# Altium footprint library 7-Connectors-10.PcbLib: 25 footprints (part 1 of 2)
Each footprint in its own frame and in the unit in brackets; x right, y up, seen from the top. Pads: shape width x height; smd on the part's side, far side on the other; paste and mask are expansions set on the pad; w line width, h text height; cw(c..) or ccw(c..) is an arc to the next point about the centre after c.
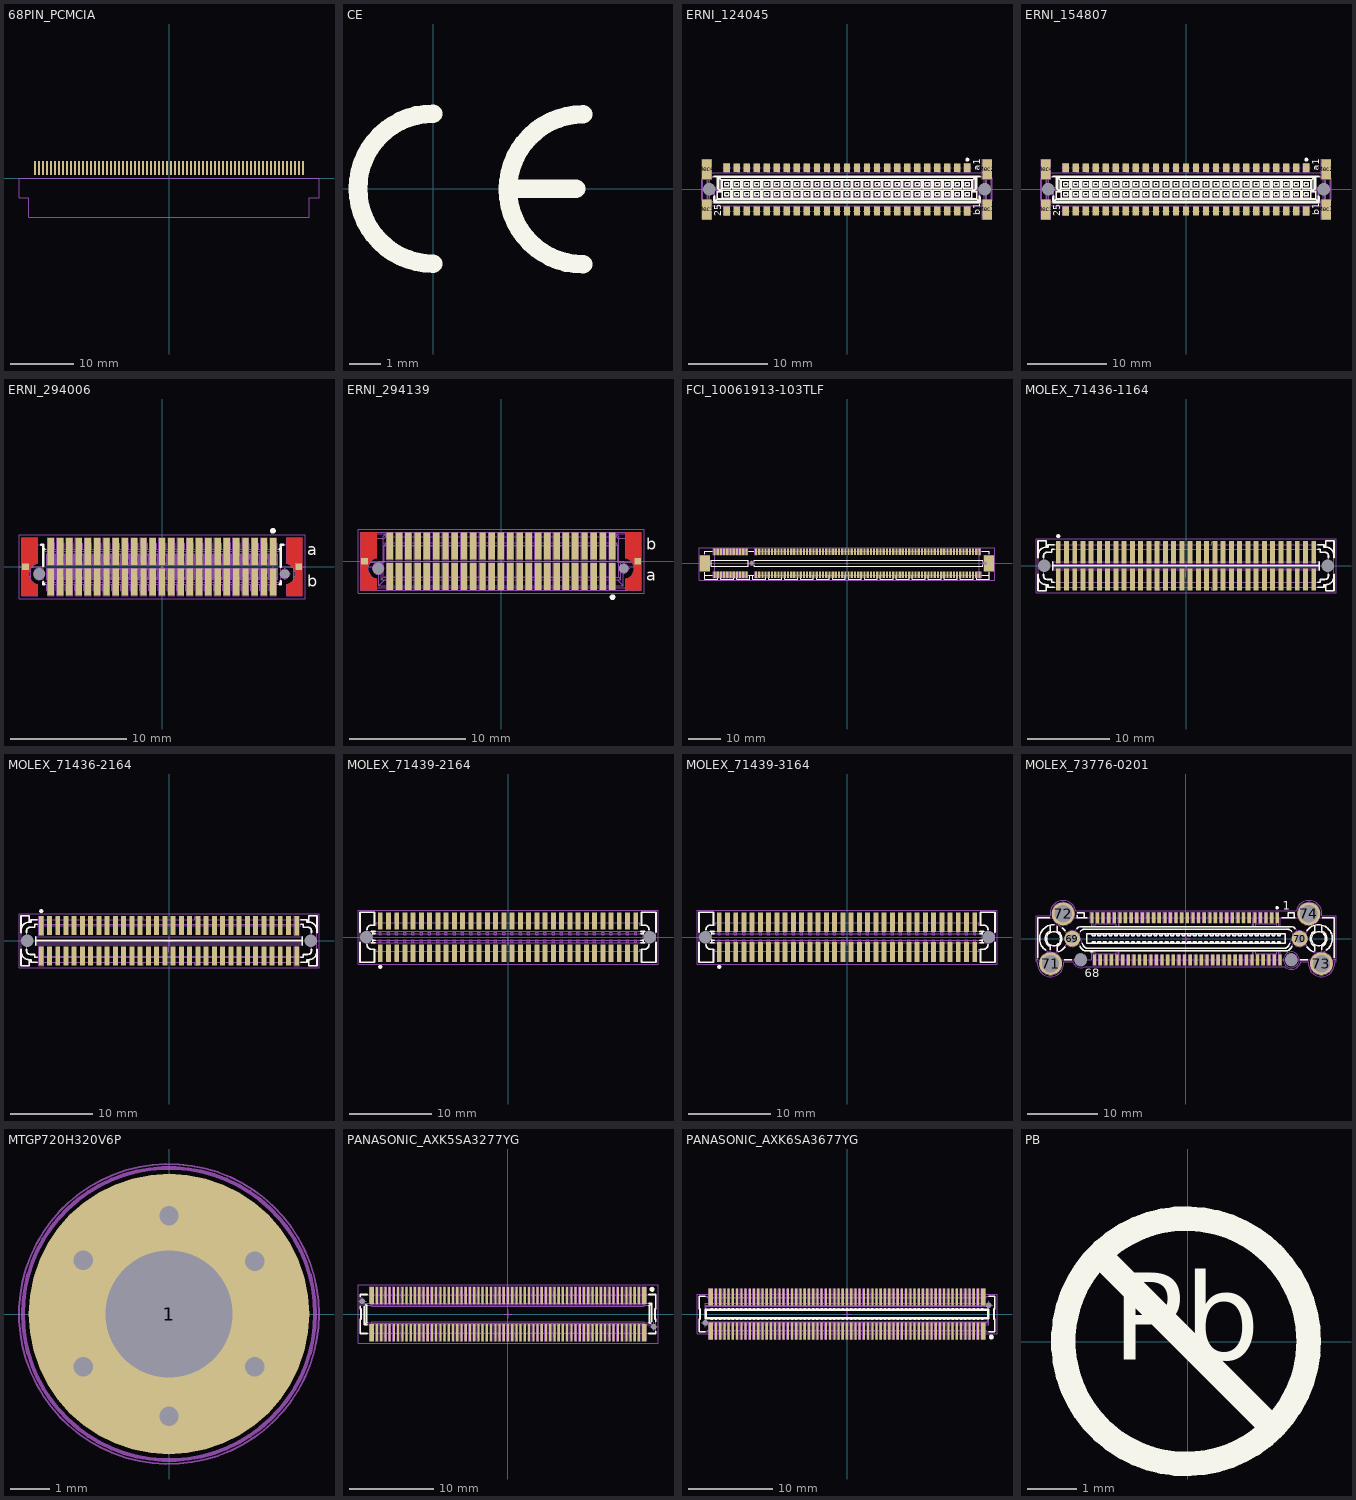
[diagram p0: the footprints below, top view; thin cyan lines are the x and y axes]

## 68PIN_PCMCIA [mil]
height 264.57
pads (68):
  oval 12x90 smd mask+2: 1_68(-837.5,64.81) 2_34(-812.5,64.81) 3_67(-787.5,64.81) 4_33(-762.5,64.81) 5_66(-737.5,64.81) 6_32(-712.5,64.81) 7_65(-687.5,64.81) 8_31(-662.5,64.81) 9_64(-637.5,64.81) 10_3(-612.5,64.81) 11_6(-587.5,64.81) 12_2(-562.5,64.81) 13_6(-537.5,64.81) 14_2(-512.5,64.81) 15_6(-487.5,64.81) 16_2(-462.5,64.81) 17_6(-437.5,64.81) 18_2(-412.5,64.81) 19_5(-387.5,64.81) 20_2(-362.5,64.81) 21_5(-337.5,64.81) 22_2(-312.5,64.81) 23-N(-287.5,64.81) 24_2(-262.5,64.81) 25-N(-237.5,64.81) 26_2(-212.5,64.81) 27-N(-187.5,64.81) 28-N(-162.5,64.81) 29-N(-137.5,64.81) 30-N(-112.5,64.81) 31-N(-87.5,64.81) 32-N(-62.5,64.81) 33-N(-37.5,64.81) 34-N(-12.5,64.81) 35_5(12.5,64.81) 36_1(37.5,64.81) 37-N(62.5,64.81) 38_1(87.5,64.81) 39_4(112.5,64.81) 40_1(137.5,64.81) 41-N(162.5,64.81) 42-N(187.5,64.81) 43-N(212.5,64.81) 44-N(237.5,64.81) 45-N(262.5,64.81) 46_1(287.5,64.81) 47_4(312.5,64.81) 48_1(337.5,64.81) 49_4(362.5,64.81) 50-N(387.5,64.81) 51-N(412.5,64.81) 52_9(437.5,64.81) 53_4(462.5,64.81) 54_8(487.5,64.81) 55_4(512.63,64.81) 56_7(537.5,64.81) 57_4(562.63,64.81) 58_6(587.5,64.81) 59_3(612.5,64.81) 60_5(637.5,64.81) 61_3(662.5,64.81) 62_4(687.5,64.81) 63_3(712.5,64.81) 64_3(737.5,64.81) 65_3(762.5,64.81) 66_2(787.5,64.81) 67_3(812.5,64.81) 68_1(837.5,64.81)
Mechanical 1:
  lines w4: -937,-122 -876,-122 -876,-242 876,-242 876,-122 937,-122 937,0 -937,0 -937,-122

## CE [mm]
Top Overlay:
  lines w0.6: 0,-2.413 cw(c0,0) 0,2.413 ; 2.53,0 4.6,0 ; 4.826,-2.438 cw(c4.826,-0.025) 4.826,2.388
3D body "ce.stp": height 0.02, standoff 0, extent -2.725,-2.725 4.82,2.725

## ERNI_124045 [mm] "50 Contacts Pitch 1.27  SMC Straight Female Connector Type B"
height 9.05
pads (56):
  rect 0.8x1.1 smd: A1(15.24,2.75) A2(13.97,2.75) A3(12.7,2.75) A4(11.43,2.75) A5(10.16,2.75) A6(8.89,2.75) A7(7.62,2.75) A8(6.35,2.75) A9(5.08,2.75) A10(3.81,2.75) A11(2.54,2.75) A12(1.27,2.75) A13(0,2.75) A14(-1.27,2.75) A15(-2.54,2.75) A16(-3.81,2.75) A17(-5.08,2.75) A18(-6.35,2.75) A19(-7.62,2.75) A20(-8.89,2.75) A21(-10.16,2.75) A22(-11.43,2.75) A23(-12.7,2.75) A24(-13.97,2.75) A25(-15.24,2.75) B1(15.24,-2.75) B2(13.97,-2.75) B3(12.7,-2.75) B4(11.43,-2.75) B5(10.16,-2.75) B6(8.89,-2.75) B7(7.62,-2.75) B8(6.35,-2.75) B9(5.08,-2.75) B10(3.81,-2.75) B11(2.54,-2.75) B12(1.27,-2.75) B13(0,-2.75) B14(-1.27,-2.75) B15(-2.54,-2.75) B16(-3.81,-2.75) B17(-5.08,-2.75) B18(-6.35,-2.75) B19(-7.62,-2.75) B20(-8.89,-2.75) B21(-10.16,-2.75) B22(-11.43,-2.75) B23(-12.7,-2.75) B24(-13.97,-2.75) B25(-15.24,-2.75)
  rect 1.2x2.5 smd: Mec1(17.75,-2.55) Mec2(17.75,2.55) Mec3(-17.75,-2.55) Mec4(-17.75,2.55)
  round 1 hole 1.6 unplated mask+0.3: Mec5(17.45,0) Mec6(-17.45,0)
Top Overlay:
  drawing of 448 lines, arcs and shapes, not listed
  text "25" at -15.9,-3.4 h0.9
  text "a1" at 16.865,2.375 h0.9
  text "b1" at 16.865,-3.275 h0.9
Mechanical 8:
  drawing of 260 lines, arcs and shapes, not listed
Mechanical 14:
  drawing of 1664 lines, arcs and shapes, not listed
  text "a1" at 16.865,2.375 h0.9
  text "b1" at 16.865,-3.275 h0.9
3D body "ERNI_124045.stp": height 9.05, standoff -0.75, extent -18.415,-3.5 18.415,3.5

## ERNI_154807 [mm] "50 Contacts Pitch 1.27  SMC Straight Female Connector Type B"
height 6.25
pads (56):
  rect 0.8x1.1 smd: A1(15.24,2.75) A2(13.97,2.75) A3(12.7,2.75) A4(11.43,2.75) A5(10.16,2.75) A6(8.89,2.75) A7(7.62,2.75) A8(6.35,2.75) A9(5.08,2.75) A10(3.81,2.75) A11(2.54,2.75) A12(1.27,2.75) A13(0,2.75) A14(-1.27,2.75) A15(-2.54,2.75) A16(-3.81,2.75) A17(-5.08,2.75) A18(-6.35,2.75) A19(-7.62,2.75) A20(-8.89,2.75) A21(-10.16,2.75) A22(-11.43,2.75) A23(-12.7,2.75) A24(-13.97,2.75) A25(-15.24,2.75) B1(15.24,-2.75) B2(13.97,-2.75) B3(12.7,-2.75) B4(11.43,-2.75) B5(10.16,-2.75) B6(8.89,-2.75) B7(7.62,-2.75) B8(6.35,-2.75) B9(5.08,-2.75) B10(3.81,-2.75) B11(2.54,-2.75) B12(1.27,-2.75) B13(0,-2.75) B14(-1.27,-2.75) B15(-2.54,-2.75) B16(-3.81,-2.75) B17(-5.08,-2.75) B18(-6.35,-2.75) B19(-7.62,-2.75) B20(-8.89,-2.75) B21(-10.16,-2.75) B22(-11.43,-2.75) B23(-12.7,-2.75) B24(-13.97,-2.75) B25(-15.24,-2.75)
  rect 1.2x2.5 smd: Mec1(17.75,-2.55) Mec2(17.75,2.55) Mec3(-17.75,-2.55) Mec4(-17.75,2.55)
  round 1 hole 1.6 unplated mask+0.3: Mec5(17.45,0) Mec6(-17.45,0)
Top Overlay:
  drawing of 448 lines, arcs and shapes, not listed
  text "25" at -15.9,-3.4 h0.9
  text "a1" at 16.865,2.375 h0.9
  text "b1" at 16.865,-3.275 h0.9
Mechanical 8:
  drawing of 260 lines, arcs and shapes, not listed
Mechanical 14:
  drawing of 1664 lines, arcs and shapes, not listed
  text "a1" at 16.865,2.375 h0.9
  text "b1" at 16.865,-3.275 h0.9
3D body "ERNI_154807.stp": height 6.25, standoff -0.75, extent -18.415,-3.5 18.415,3.5

## ERNI_294006 [mm] "50 Contacts Pitch 0.8  SMT Vertical Female Connector Type MicroCon"
height 4
pads (54):
  rect 0.55x2.35 smd: A1(9.6,1.325) A2(8.8,1.325) A3(8,1.325) A4(7.2,1.325) A5(6.4,1.325) A6(5.6,1.325) A7(4.8,1.325) A8(4,1.325) A9(3.2,1.325) A10(2.4,1.325) A11(1.6,1.325) A12(0.8,1.325) A13(0,1.325) A14(-0.8,1.325) A15(-1.6,1.325) A16(-2.4,1.325) A17(-3.2,1.325) A18(-4,1.325) A19(-4.8,1.325) A20(-5.6,1.325) A21(-6.4,1.325) A22(-7.2,1.325) A23(-8,1.325) A24(-8.8,1.325) A25(-9.6,1.325) B1(9.6,-1.325) B2(8.8,-1.325) B3(8,-1.325) B4(7.2,-1.325) B5(6.4,-1.325) B6(5.6,-1.325) B7(4.8,-1.325) B8(4,-1.325) B9(3.2,-1.325) B10(2.4,-1.325) B11(1.6,-1.325) B12(0.8,-1.325) B13(0,-1.325) B14(-0.8,-1.325) B15(-1.6,-1.325) B16(-2.4,-1.325) B17(-3.2,-1.325) B18(-4,-1.325) B19(-4.8,-1.325) B20(-5.6,-1.325) B21(-6.4,-1.325) B22(-7.2,-1.325) B23(-8,-1.325) B24(-8.8,-1.325) B25(-9.6,-1.325)
  rect 0.6x0.6 smd: MEC1(-11.8,0) MEC2(11.8,0)
  round 0.5 hole 0.8 unplated mask+0.15: Mec5(10.6,-0.625)
  round 0.5 hole 1 unplated mask+0.25: Mec6(-10.6,-0.625)
Top Layer:
  region: -12.1,-2.5 -10.75,-2.5 -10.75,-1.512 -10.852,-1.489 -11.046,-1.407 -11.215,-1.282 -11.35,-1.122 -11.445,-0.934 -11.494,-0.73 -11.494,-0.52 -11.445,-0.316 -11.35,-0.128 -11.215,0.032 -11.046,0.157 -10.852,0.239 -10.75,0.262 -10.75,2.5 -12.1,2.5
  region: 10.75,-2.5 12.1,-2.5 12.1,2.5 10.75,2.5 10.75,0.262 10.853,0.239 11.046,0.157 11.215,0.032 11.351,-0.128 11.445,-0.316 11.494,-0.52 11.494,-0.73 11.445,-0.934 11.351,-1.122 11.215,-1.282 11.046,-1.407 10.853,-1.489 10.75,-1.512
Top Overlay:
  circle w0.25: c9.575,3.101 r0.125
  lines w0.2: -10.45,1.9 -10.25,1.9 -10.25,0.094 ; -10.25,-1.344 -10.25,-1.5 -10.175,-1.5 ; -10.25,1.5 -10.175,1.5 ; 10.175,-1.5 10.25,-1.5 10.25,-1.231 ; 10.175,1.5 10.25,1.5 ; 10.25,0 10.25,1.9 10.45,1.9
  text "a" at 12.55,1 h1
  text "b" at 12.525,-1.705 h1
Mechanical 8:
  drawing of 338 lines, arcs and shapes, not listed
Mechanical 14:
  drawing of 978 lines, arcs and shapes, not listed
  text "a" at 12.55,1 h1
  text "b" at 12.525,-1.705 h1
Mechanical 15:
  lines w0.05: -12.35,-2.75 12.35,-2.75 12.35,2.75 -12.35,2.75 -12.35,-2.75
3D body "ERNI_294006.stp": height 4.6, standoff -0.7, extent -11.95,-2.35 11.95,2.35

## ERNI_294139 [mm] "50 Contacts Pitch 0.8  SMT Vertical Male Connector Type MicroCon"
height 4.8
pads (54):
  rect 0.55x2.35 smd: A1(9.6,-1.325) A2(8.8,-1.325) A3(8,-1.325) A4(7.2,-1.325) A5(6.4,-1.325) A6(5.6,-1.325) A7(4.8,-1.325) A8(4,-1.325) A9(3.2,-1.325) A10(2.4,-1.325) A11(1.6,-1.325) A12(0.8,-1.325) A13(0,-1.325) A14(-0.8,-1.325) A15(-1.6,-1.325) A16(-2.4,-1.325) A17(-3.2,-1.325) A18(-4,-1.325) A19(-4.8,-1.325) A20(-5.6,-1.325) A21(-6.4,-1.325) A22(-7.2,-1.325) A23(-8,-1.325) A24(-8.8,-1.325) A25(-9.6,-1.325) B1(9.6,1.325) B2(8.8,1.325) B3(8,1.325) B4(7.2,1.325) B5(6.4,1.325) B6(5.6,1.325) B7(4.8,1.325) B8(4,1.325) B9(3.2,1.325) B10(2.4,1.325) B11(1.6,1.325) B12(0.8,1.325) B13(0,1.325) B14(-0.8,1.325) B15(-1.6,1.325) B16(-2.4,1.325) B17(-3.2,1.325) B18(-4,1.325) B19(-4.8,1.325) B20(-5.6,1.325) B21(-6.4,1.325) B22(-7.2,1.325) B23(-8,1.325) B24(-8.8,1.325) B25(-9.6,1.325)
  rect 0.6x0.6 smd: MEC1(-11.8,0) MEC2(11.8,0)
  round 0.5 hole 0.8 unplated mask+0.15: Mec5(10.6,-0.625)
  round 0.5 hole 1 unplated mask+0.25: Mec6(-10.6,-0.625)
Top Layer:
  region: -12.1,-2.5 -10.75,-2.5 -10.75,-1.512 -10.852,-1.489 -11.046,-1.407 -11.215,-1.282 -11.35,-1.122 -11.445,-0.934 -11.494,-0.73 -11.494,-0.52 -11.445,-0.316 -11.35,-0.128 -11.215,0.032 -11.046,0.157 -10.852,0.239 -10.75,0.262 -10.75,2.5 -12.1,2.5
  region: 10.75,-2.5 12.1,-2.5 12.1,2.5 10.75,2.5 10.75,0.262 10.853,0.239 11.046,0.157 11.215,0.032 11.351,-0.128 11.445,-0.316 11.494,-0.52 11.494,-0.73 11.445,-0.934 11.351,-1.122 11.215,-1.282 11.046,-1.407 10.853,-1.489 10.75,-1.512
Top Overlay:
  circle w0.25: c9.625,-3.101 r0.125
  text "b" at 12.55,1 h1
  text "a" at 12.525,-1.705 h1
Mechanical 8:
  drawing of 377 lines, arcs and shapes, not listed
Mechanical 14:
  drawing of 256 lines, arcs and shapes, not listed
  text "b" at 12.55,1 h1
  text "a" at 12.525,-1.705 h1
Mechanical 15:
  lines w0.05: -12.35,-2.75 -12.35,2.75 12.35,2.75 12.35,-2.75 -12.35,-2.75
3D body "ERNI_294139.stp": height 4.8, standoff -0.7, extent -12.1,-2.5 12.1,2.5

## FCI_10061913-103TLF [mm] "164 Positions PCI Express Surface Mount Card Edge Connector"
height 11.1
pads (168):
  rect 0.7x2 smd: A1(-41.5,3.6) A2(-40.5,3.6) A3(-39.5,3.6) A4(-38.5,3.6) A5(-37.5,3.6) A6(-36.5,3.6) A7(-35.5,3.6) A8(-34.5,3.6) A9(-33.5,3.6) A10(-32.5,3.6) A11(-31.5,3.6) A12(-28.5,3.6) A13(-27.5,3.6) A14(-26.5,3.6) A15(-25.5,3.6) A16(-24.5,3.6) A17(-23.5,3.6) A18(-22.5,3.6) A19(-21.5,3.6) A20(-20.5,3.6) A21(-19.5,3.6) A22(-18.5,3.6) A23(-17.5,3.6) A24(-16.5,3.6) A25(-15.5,3.6) A26(-14.5,3.6) A27(-13.5,3.6) A28(-12.5,3.6) A29(-11.5,3.6) A30(-10.5,3.6) A31(-9.5,3.6) A32(-8.5,3.6) A33(-7.5,3.6) A34(-6.5,3.6) A35(-5.5,3.6) A36(-4.5,3.6) A37(-3.5,3.6) A38(-2.5,3.6) A39(-1.5,3.6) A40(-0.5,3.6) A41(0.5,3.6) A42(1.5,3.6) A43(2.5,3.6) A44(3.5,3.6) A45(4.5,3.6) A46(5.5,3.6) A47(6.5,3.6) A48(7.5,3.6) A49(8.5,3.6) A50(9.5,3.6) A51(10.5,3.6) A52(11.5,3.6) A53(12.5,3.6) A54(13.5,3.6) A55(14.5,3.6) A56(15.5,3.6) A57(16.5,3.6) A58(17.5,3.6) A59(18.5,3.6) A60(19.5,3.6) A61(20.5,3.6) A62(21.5,3.6) A63(22.5,3.6) A64(23.5,3.6) A65(24.5,3.6) A66(25.5,3.6) A67(26.5,3.6) A68(27.5,3.6) A69(28.5,3.6) A70(29.5,3.6) A71(30.5,3.6) A72(31.5,3.6) A73(32.5,3.6) A74(33.5,3.6) A75(34.5,3.6) A76(35.5,3.6) A77(36.5,3.6) A78(37.5,3.6) A79(38.5,3.6) A80(39.5,3.6) A81(40.5,3.6) A82(41.5,3.6) B1(-41.5,-3.6) B2(-40.5,-3.6) B3(-39.5,-3.6) B4(-38.5,-3.6) B5(-37.5,-3.6) B6(-36.5,-3.6) B7(-35.5,-3.6) B8(-34.5,-3.6) B9(-33.5,-3.6) B10(-32.5,-3.6) B11(-31.5,-3.6) B12(-28.5,-3.6) B13(-27.5,-3.6) B14(-26.5,-3.6) B15(-25.5,-3.6) B16(-24.5,-3.6) B17(-23.5,-3.6) B18(-22.5,-3.6) B19(-21.5,-3.6) B20(-20.5,-3.6) B21(-19.5,-3.6) B22(-18.5,-3.6) B23(-17.5,-3.6) B24(-16.5,-3.6) B25(-15.5,-3.6) B26(-14.5,-3.6) B27(-13.5,-3.6) B28(-12.5,-3.6) B29(-11.5,-3.6) B30(-10.5,-3.6) B31(-9.5,-3.6) B32(-8.5,-3.6) B33(-7.5,-3.6) B34(-6.5,-3.6) B35(-5.5,-3.6) B36(-4.5,-3.6) B37(-3.5,-3.6) B38(-2.5,-3.6) B39(-1.5,-3.6) B40(-0.5,-3.6) B41(0.5,-3.6) B42(1.5,-3.6) B43(2.5,-3.6) B44(3.5,-3.6) B45(4.5,-3.6) B46(5.5,-3.6) B47(6.5,-3.6) B48(7.5,-3.6) B49(8.5,-3.6) B50(9.5,-3.6) B51(10.5,-3.6) B52(11.5,-3.6) B53(12.5,-3.6) B54(13.5,-3.6) B55(14.5,-3.6) B56(15.5,-3.6) B57(16.5,-3.6) B58(17.5,-3.6) B59(18.5,-3.6) B60(19.5,-3.6) B61(20.5,-3.6) B62(21.5,-3.6) B63(22.5,-3.6) B64(23.5,-3.6) B65(24.5,-3.6) B66(25.5,-3.6) B67(26.5,-3.6) B68(27.5,-3.6) B69(28.5,-3.6) B70(29.5,-3.6) B71(30.5,-3.6) B72(31.5,-3.6) B73(32.5,-3.6) B74(33.5,-3.6) B75(34.5,-3.6) B76(35.5,-3.6) B77(36.5,-3.6) B78(37.5,-3.6) B79(38.5,-3.6) B80(39.5,-3.6) B81(40.5,-3.6) B82(41.5,-3.6)
  rect 3x5 smd: MECH1(-44.5,0) MECH2(44.5,0)
  round 1 hole 1.2 unplated mask+0.1: POS1(-29.85,0) POS2(43.3,0)
Top Overlay:
  lines w0.2: -44.505,-2.9 -44.505,-3.725 ; -44.505,2.9 -44.505,3.725 -42.25,3.725 ; -42.25,-3.725 -44.505,-3.725 ; -40.505,-3.725 -40.505,-5.075 -44.505,-5.075 -44.505,-3.725 ; -39.505,-3.725 -39.505,-5.075 -35.505,-5.075 -35.505,-3.725 ; -34.505,-3.725 -34.505,-5.075 -30.505,-5.075 -30.505,-3.725 ; -30.75,-3.725 -29.25,-3.725 ; -30.75,3.725 -29.25,3.725 ; -29.505,-3.725 -29.505,-5.075 -25.505,-5.075 -25.505,-3.725 ; -29.115,-0.678 -29.115,-0.9 42.535,-0.9 42.535,-0.644 ; -29.115,0.678 -29.115,0.9 42.535,0.9 42.535,0.644 ; -24.505,-3.725 -24.505,-5.075 -20.505,-5.075 -20.505,-3.725 ; -19.505,-3.725 -19.505,-5.075 -15.505,-5.075 -15.505,-3.725 ; -14.505,-3.725 -14.505,-5.075 -10.505,-5.075 -10.505,-3.725 ; -9.505,-3.725 -9.505,-5.075 -5.505,-5.075 -5.505,-3.725 ; -4.505,-3.725 -4.505,-5.075 -0.505,-5.075 -0.505,-3.725 ; 0.495,-3.725 0.495,-5.075 4.495,-5.075 4.495,-3.725 ; 5.495,-3.725 5.495,-5.075 9.495,-5.075 9.495,-3.725 ; 10.495,-3.725 10.495,-5.075 14.495,-5.075 14.495,-3.725 ; 15.495,-3.725 15.495,-5.075 19.495,-5.075 19.495,-3.725 ; 20.495,-3.725 20.495,-5.075 24.495,-5.075 24.495,-3.725 ; 25.495,-3.725 25.495,-5.075 29.495,-5.075 29.495,-3.725 ; 30.495,-3.725 30.495,-5.075 34.495,-5.075 34.495,-3.725 ; 35.495,-3.725 35.495,-5.075 39.495,-5.075 39.495,-3.725 ; 40.495,-3.725 40.503,-5.08 44.495,-5.08 44.495,-2.9 ; 42.25,-3.725 44.495,-3.725 ; 42.25,3.725 44.495,3.725 44.495,2.9 ; -42.545,-0.9 -30.895,-0.9 -30.895,0.9 -42.545,0.9 -42.545,-0.9
Mechanical 8:
  drawing of 190 lines, arcs and shapes, not listed
Mechanical 14:
  lines w0.1: -44.505,-1.975 -45.505,-1.975 -45.505,2.025 -44.505,2.025 ; -40.505,-3.725 -40.505,-5.075 -44.505,-5.075 -44.505,-3.725 ; -39.505,-3.725 -39.505,-5.075 -35.505,-5.075 -35.505,-3.725 ; -34.505,-3.725 -34.505,-5.075 -30.505,-5.075 -30.505,-3.725 ; -29.505,-3.725 -29.505,-5.075 -25.505,-5.075 -25.505,-3.725 ; -24.505,-3.725 -24.505,-5.075 -20.505,-5.075 -20.505,-3.725 ; -19.505,-3.725 -19.505,-5.075 -15.505,-5.075 -15.505,-3.725 ; -14.505,-3.725 -14.505,-5.075 -10.505,-5.075 -10.505,-3.725 ; -9.505,-3.725 -9.505,-5.075 -5.505,-5.075 -5.505,-3.725 ; -4.505,-3.725 -4.505,-5.075 -0.505,-5.075 -0.505,-3.725 ; 0.495,-3.725 0.495,-5.075 4.495,-5.075 4.495,-3.725 ; 5.495,-3.725 5.495,-5.075 9.495,-5.075 9.495,-3.725 ; 10.495,-3.725 10.495,-5.075 14.495,-5.075 14.495,-3.725 ; 15.495,-3.725 15.495,-5.075 19.495,-5.075 19.495,-3.725 ; 20.495,-3.725 20.495,-5.075 24.495,-5.075 24.495,-3.725 ; 25.495,-3.725 25.495,-5.075 29.495,-5.075 29.495,-3.725 ; 30.495,-3.725 30.495,-5.075 34.495,-5.075 34.495,-3.725 ; 35.495,-3.725 35.495,-5.075 39.495,-5.075 39.495,-3.725 ; 40.495,-3.725 40.503,-5.08 44.495,-5.08 44.495,3.725 -44.505,3.725 -44.505,-3.725 ; 44.495,-3.725 -44.505,-3.725 ; 44.495,-1.975 45.495,-1.975 45.495,2.025 44.495,2.025 ; -42.545,-0.9 -30.895,-0.9 -30.895,0.9 -42.545,0.9 -42.545,-0.9 ; -29.115,-0.9 42.535,-0.9 42.535,0.9 -29.115,0.9 -29.115,-0.9
Mechanical 15:
  lines w0.05: -46.25,-5.33 -46.25,4.85 46.25,4.85 46.25,-5.33 -46.25,-5.33
3D body "FCI_10061913-103TLF.stp": height 11.1, standoff -0.9, extent -45.505,-5.075 45.495,4.125

## MOLEX_71436-1164 [mm] "1mm Centerline, FH (IEEE 1386) Surface Mount, Stacking Board-to-Board Male Connectors"
height 7.48
pads (66):
  rect 0.6x2.7 smd: 1(-15.5,1.65) 2(-15.5,-1.65) 3(-14.5,1.65) 4(-14.5,-1.65) 5(-13.5,1.65) 6(-13.5,-1.65) 7(-12.5,1.65) 8(-12.5,-1.65) 9(-11.5,1.65) 10(-11.5,-1.65) 11(-10.5,1.65) 12(-10.5,-1.65) 13(-9.5,1.65) 14(-9.5,-1.65) 15(-8.5,1.65) 16(-8.5,-1.65) 17(-7.5,1.65) 18(-7.5,-1.65) 19(-6.5,1.65) 20(-6.5,-1.65) 21(-5.5,1.65) 22(-5.5,-1.65) 23(-4.5,1.65) 24(-4.5,-1.65) 25(-3.5,1.65) 26(-3.5,-1.65) 27(-2.5,1.65) 28(-2.5,-1.65) 29(-1.5,1.65) 30(-1.5,-1.65) 31(-0.5,1.65) 32(-0.5,-1.65) 33(0.5,1.65) 34(0.5,-1.65) 35(1.5,1.65) 36(1.5,-1.65) 37(2.5,1.65) 38(2.5,-1.65) 39(3.5,1.65) 40(3.5,-1.65) 41(4.5,1.65) 42(4.5,-1.65) 43(5.5,1.65) 44(5.5,-1.65) 45(6.5,1.65) 46(6.5,-1.65) 47(7.5,1.65) 48(7.5,-1.65) 49(8.5,1.65) 50(8.5,-1.65) 51(9.5,1.65) 52(9.5,-1.65) 53(10.5,1.65) 54(10.5,-1.65) 55(11.5,1.65) 56(11.5,-1.65) 57(12.5,1.65) 58(12.5,-1.65) 59(13.5,1.65) 60(13.5,-1.65) 61(14.5,1.65) 62(14.5,-1.65) 63(15.5,1.65) 64(15.5,-1.65)
  round 1 hole 1.5 unplated: 65(-17.2,0) 66(17.2,0)
Top Overlay:
  circle w0.25: c-15.5,3.6 r0.125
  lines w0.2: -17.95,-1.275 ccw(c-16.95,-1.275) -16.95,-2.275 ; -17.95,-1 -17.95,-3.025 -16.95,-3.025 -16.95,-2.275 ; -17.95,1 -17.95,3.025 -16.95,3.025 -16.95,2.275 ; -17.95,1.275 cw(c-16.95,1.275) -16.95,2.275 ; -17.29,-1 -17.29,-1.2 ccw(c-16.84,-1.2) -16.84,-1.65 -16.3,-1.65 -16.3,-2 -16,-2 ; -17.29,1 -17.29,1.2 cw(c-16.84,1.2) -16.84,1.65 -16.3,1.65 -16.3,2 -16,2 ; -16.15,-0.5 -16.15,0.5 ; -16.15,0 16.15,0 ; -16,-2.575 -16.75,-2.575 -16.75,-2.275 -16.95,-2.275 ; -16,2.575 -16.75,2.575 -16.75,2.275 -16.95,2.275 ; 16,-2.575 16.75,-2.575 16.75,-2.275 16.95,-2.275 ; 16,-2 16.3,-2 16.3,-1.65 16.84,-1.65 ccw(c16.84,-1.2) 17.29,-1.2 17.29,-1 ; 16,2 16.3,2 16.3,1.65 16.84,1.65 cw(c16.84,1.2) 17.29,1.2 17.29,1 ; 16,2.575 16.75,2.575 16.75,2.275 16.95,2.275 ; 16.15,-0.5 16.15,0.5 ; 17.95,-1.275 cw(c16.95,-1.275) 16.95,-2.275 ; 17.95,-1 17.95,-3.025 16.95,-3.025 16.95,-2.275 ; 17.95,1 17.95,3.025 16.95,3.025 16.95,2.275 ; 17.95,1.275 ccw(c16.95,1.275) 16.95,2.275
Mechanical 14:
  drawing of 251 lines, arcs and shapes, not listed
Mechanical 15:
  lines w0.05: -18.2,-3.275 -18.2,3.275 18.2,3.275 18.2,-3.275 -18.2,-3.275
3D body "MOLEX_71436-1164.stp": height 7.35, standoff -0.75, extent -17.95,-3.025 17.95,3.075

## MOLEX_71436-2164 [mm] "1mm Centerline, FH (IEEE 1386) Surface Mount, Stacking Board-to-Board Male Connectors"
height 8.48
pads (66):
  rect 0.6x2.3 smd: 1(-15.5,1.85) 2(-15.5,-1.85) 3(-14.5,1.85) 4(-14.5,-1.85) 5(-13.5,1.85) 6(-13.5,-1.85) 7(-12.5,1.85) 8(-12.5,-1.85) 9(-11.5,1.85) 10(-11.5,-1.85) 11(-10.5,1.85) 12(-10.5,-1.85) 13(-9.5,1.85) 14(-9.5,-1.85) 15(-8.5,1.85) 16(-8.5,-1.85) 17(-7.5,1.85) 18(-7.5,-1.85) 19(-6.5,1.85) 20(-6.5,-1.85) 21(-5.5,1.85) 22(-5.5,-1.85) 23(-4.5,1.85) 24(-4.5,-1.85) 25(-3.5,1.85) 26(-3.5,-1.85) 27(-2.5,1.85) 28(-2.5,-1.85) 29(-1.5,1.85) 30(-1.5,-1.85) 31(-0.5,1.85) 32(-0.5,-1.85) 33(0.5,1.85) 34(0.5,-1.85) 35(1.5,1.85) 36(1.5,-1.85) 37(2.5,1.85) 38(2.5,-1.85) 39(3.5,1.85) 40(3.5,-1.85) 41(4.5,1.85) 42(4.5,-1.85) 43(5.5,1.85) 44(5.5,-1.85) 45(6.5,1.85) 46(6.5,-1.85) 47(7.5,1.85) 48(7.5,-1.85) 49(8.5,1.85) 50(8.5,-1.85) 51(9.5,1.85) 52(9.5,-1.85) 53(10.5,1.85) 54(10.5,-1.85) 55(11.5,1.85) 56(11.5,-1.85) 57(12.5,1.85) 58(12.5,-1.85) 59(13.5,1.85) 60(13.5,-1.85) 61(14.5,1.85) 62(14.5,-1.85) 63(15.5,1.85) 64(15.5,-1.85)
  round 1 hole 1.5 unplated: 65(-17.2,0) 66(17.2,0)
Top Overlay:
  circle w0.25: c-15.5,3.6 r0.125
  lines w0.2: -17.95,-1.275 ccw(c-16.95,-1.275) -16.95,-2.275 ; -17.95,-1 -17.95,-3.025 -16.95,-3.025 -16.95,-2.275 ; -17.95,1 -17.95,3.025 -16.95,3.025 -16.95,2.275 ; -17.95,1.275 cw(c-16.95,1.275) -16.95,2.275 ; -17.29,-1 -17.29,-1.2 ccw(c-16.84,-1.2) -16.84,-1.65 -16.3,-1.65 -16.3,-2 -16,-2 ; -17.29,1 -17.29,1.2 cw(c-16.84,1.2) -16.84,1.65 -16.3,1.65 -16.3,2 -16,2 ; -16.15,-0.5 -16.15,0.5 ; -16.15,0 16.15,0 ; -16,-2.575 -16.75,-2.575 -16.75,-2.275 -16.95,-2.275 ; -16,2.575 -16.75,2.575 -16.75,2.275 -16.95,2.275 ; 16,-2.575 16.75,-2.575 16.75,-2.275 16.95,-2.275 ; 16,-2 16.3,-2 16.3,-1.65 16.84,-1.65 ccw(c16.84,-1.2) 17.29,-1.2 17.29,-1 ; 16,2 16.3,2 16.3,1.65 16.84,1.65 cw(c16.84,1.2) 17.29,1.2 17.29,1 ; 16,2.575 16.75,2.575 16.75,2.275 16.95,2.275 ; 16.15,-0.5 16.15,0.5 ; 17.95,-1.275 cw(c16.95,-1.275) 16.95,-2.275 ; 17.95,-1 17.95,-3.025 16.95,-3.025 16.95,-2.275 ; 17.95,1 17.95,3.025 16.95,3.025 16.95,2.275 ; 17.95,1.275 ccw(c16.95,1.275) 16.95,2.275
Mechanical 8:
  drawing of 284 lines, arcs and shapes, not listed
Mechanical 14:
  drawing of 251 lines, arcs and shapes, not listed
Mechanical 15:
  lines w0.05: -18.2,-3.275 18.2,-3.275 18.2,3.275 -18.2,3.275 -18.2,-3.275
3D body "MOLEX_71436-2164.stp": height 8.35, standoff -0.75, extent -17.95,-3.05 17.95,3.05

## MOLEX_71439-2164 [mm] "2x32 Position, 1mm Centerline, Surface Mount, Stacking Board-to-Board Female Connector (IEEE 1386 Mezzanine Connector)"
height 8.48
pads (66):
  rect 0.6x2.1 smd: 1(-15.5,-1.95) 2(-15.5,1.95) 3(-14.5,-1.95) 4(-14.5,1.95) 5(-13.5,-1.95) 6(-13.5,1.95) 7(-12.5,-1.95) 8(-12.5,1.95) 9(-11.5,-1.95) 10(-11.5,1.95) 11(-10.5,-1.95) 12(-10.5,1.95) 13(-9.5,-1.95) 14(-9.5,1.95) 15(-8.5,-1.95) 16(-8.5,1.95) 17(-7.5,-1.95) 18(-7.5,1.95) 19(-6.5,-1.95) 20(-6.5,1.95) 21(-5.5,-1.95) 22(-5.5,1.95) 23(-4.5,-1.95) 24(-4.5,1.95) 25(-3.5,-1.95) 26(-3.5,1.95) 27(-2.5,-1.95) 28(-2.5,1.95) 29(-1.5,-1.95) 30(-1.5,1.95) 31(-0.5,-1.95) 32(-0.5,1.95) 33(0.5,-1.95) 34(0.5,1.95) 35(1.5,-1.95) 36(1.5,1.95) 37(2.5,-1.95) 38(2.5,1.95) 39(3.5,-1.95) 40(3.5,1.95) 41(4.5,-1.95) 42(4.5,1.95) 43(5.5,-1.95) 44(5.5,1.95) 45(6.5,-1.95) 46(6.5,1.95) 47(7.5,-1.95) 48(7.5,1.95) 49(8.5,-1.95) 50(8.5,1.95) 51(9.5,-1.95) 52(9.5,1.95) 53(10.5,-1.95) 54(10.5,1.95) 55(11.5,-1.95) 56(11.5,1.95) 57(12.5,-1.95) 58(12.5,1.95) 59(13.5,-1.95) 60(13.5,1.95) 61(14.5,-1.95) 62(14.5,1.95) 63(15.5,-1.95) 64(15.5,1.95)
  round 1 hole 1.5 unplated: 65(-17.2,0) 66(17.2,0)
Top Overlay:
  circle w0.25: c-15.5,-3.6 r0.125
  lines w0.2: -17.95,-0.6 -17.95,-3.025 -16.2,-3.025 -16.2,-1.46 -16.56,-1.46 cw(c-16.56,-0.91) -17.11,-0.91 ; -17.95,0.6 -17.95,3.025 -16.2,3.025 -16.2,1.46 -16.56,1.46 ccw(c-16.56,0.91) -17.11,0.91 ; -16.6,-0.69 -16.1,-0.69 ; -16.6,0.69 -16.1,0.69 ; -16.4,-0.69 -16.4,-0.345 ; -16.4,-0.396 -16.1,-0.396 ; -16.4,0.345 -16.4,0.69 ; -16.4,0.396 -16.1,0.396 ; 16.1,-0.69 16.6,-0.69 ; 16.1,-0.396 16.4,-0.396 ; 16.1,0.396 16.4,0.396 ; 16.1,0.69 16.6,0.69 ; 16.4,-0.69 16.4,-0.345 ; 16.4,0.345 16.4,0.69 ; 17.11,-0.91 cw(c16.56,-0.91) 16.56,-1.46 16.2,-1.46 16.2,-3.025 17.95,-3.025 17.95,-0.6 ; 17.11,0.91 ccw(c16.56,0.91) 16.56,1.46 16.2,1.46 16.2,3.025 17.95,3.025 17.95,0.6
Mechanical 8:
  lines w0.1: -1,0 0,0 0,-1
Mechanical 14:
  drawing of 608 lines, arcs and shapes, not listed
Mechanical 15:
  lines w0.05: -18.2,-3.275 18.2,-3.275 18.2,3.275 -18.2,3.275 -18.2,-3.275
3D body "MOLEX_71439-2164.stp": height 10.31, standoff -0.79, extent -17.95,-3.05 17.95,3.05

## MOLEX_71439-3164 [mm] "2x32 Position, 1mm Centerline, Surface Mount, Stacking Board-to-Board Female Connector (IEEE 1386 Mezzanine Connector)"
height 10.48
pads (66):
  rect 0.6x2.4 smd: 1(-15.5,-1.8) 2(-15.5,1.8) 3(-14.5,-1.8) 4(-14.5,1.8) 5(-13.5,-1.8) 6(-13.5,1.8) 7(-12.5,-1.8) 8(-12.5,1.8) 9(-11.5,-1.8) 10(-11.5,1.8) 11(-10.5,-1.8) 12(-10.5,1.8) 13(-9.5,-1.8) 14(-9.5,1.8) 15(-8.5,-1.8) 16(-8.5,1.8) 17(-7.5,-1.8) 18(-7.5,1.8) 19(-6.5,-1.8) 20(-6.5,1.8) 21(-5.5,-1.8) 22(-5.5,1.8) 23(-4.5,-1.8) 24(-4.5,1.8) 25(-3.5,-1.8) 26(-3.5,1.8) 27(-2.5,-1.8) 28(-2.5,1.8) 29(-1.5,-1.8) 30(-1.5,1.8) 31(-0.5,-1.8) 32(-0.5,1.8) 33(0.5,-1.8) 34(0.5,1.8) 35(1.5,-1.8) 36(1.5,1.8) 37(2.5,-1.8) 38(2.5,1.8) 39(3.5,-1.8) 40(3.5,1.8) 41(4.5,-1.8) 42(4.5,1.8) 43(5.5,-1.8) 44(5.5,1.8) 45(6.5,-1.8) 46(6.5,1.8) 47(7.5,-1.8) 48(7.5,1.8) 49(8.5,-1.8) 50(8.5,1.8) 51(9.5,-1.8) 52(9.5,1.8) 53(10.5,-1.8) 54(10.5,1.8) 55(11.5,-1.8) 56(11.5,1.8) 57(12.5,-1.8) 58(12.5,1.8) 59(13.5,-1.8) 60(13.5,1.8) 61(14.5,-1.8) 62(14.5,1.8) 63(15.5,-1.8) 64(15.5,1.8)
  round 1 hole 1.5 unplated: 65(-17.2,0) 66(17.2,0)
Top Overlay:
  circle w0.25: c-15.5,-3.6 r0.125
  lines w0.2: -17.95,-0.6 -17.95,-3.025 -16.2,-3.025 -16.2,-1.46 -16.56,-1.46 cw(c-16.56,-0.91) -17.11,-0.91 ; -17.95,0.6 -17.95,3.025 -16.2,3.025 -16.2,1.46 -16.56,1.46 ccw(c-16.56,0.91) -17.11,0.91 ; -16.6,-0.69 -16.1,-0.69 ; -16.6,0.69 -16.1,0.69 ; -16.4,-0.69 -16.4,-0.345 ; -16.4,-0.396 -16.1,-0.396 ; -16.4,0.345 -16.4,0.69 ; -16.4,0.396 -16.1,0.396 ; 16.1,-0.69 16.6,-0.69 ; 16.1,-0.396 16.4,-0.396 ; 16.1,0.396 16.4,0.396 ; 16.1,0.69 16.6,0.69 ; 16.4,-0.69 16.4,-0.345 ; 16.4,0.345 16.4,0.69 ; 17.11,-0.91 cw(c16.56,-0.91) 16.56,-1.46 16.2,-1.46 16.2,-3.025 17.95,-3.025 17.95,-0.6 ; 17.11,0.91 ccw(c16.56,0.91) 16.56,1.46 16.2,1.46 16.2,3.025 17.95,3.025 17.95,0.6
Mechanical 8:
  lines w0.1: -1,0 0,0 0,-1
Mechanical 14:
  drawing of 608 lines, arcs and shapes, not listed
Mechanical 15:
  lines w0.05: -18.2,-3.275 18.2,-3.275 18.2,3.275 -18.2,3.275 -18.2,-3.275
3D body "MOLEX_71439-3164.stp": height 10.31, standoff -0.79, extent -17.95,-3.025 17.95,3.075

## MOLEX_73776-0201 [mm] "0.80mm Pitch, 68 Contacts, Ultra+ VHDCI Surface Mount Vertical Receptacle With Screwlock Kit"
height 10.7
pads (76):
  rect 0.45x1.5 smd: 1(13,3) 2(12.2,3) 3(11.4,3) 4(10.6,3) 5(9.8,3) 6(9,3) 7(8.2,3) 8(7.4,3) 9(6.6,3) 10(5.8,3) 11(5,3) 12(4.2,3) 13(3.4,3) 14(2.6,3) 15(1.8,3) 16(1,3) 17(0.2,3) 18(-0.6,3) 19(-1.4,3) 20(-2.2,3) 21(-3,3) 22(-3.8,3) 23(-4.6,3) 24(-5.4,3) 25(-6.2,3) 26(-7,3) 27(-7.8,3) 28(-8.6,3) 29(-9.4,3) 30(-10.2,3) 31(-11,3) 32(-11.8,3) 33(-12.6,3) 34(-13.4,3) 35(13.4,-3) 36(12.6,-3) 37(11.8,-3) 38(11,-3) 39(10.2,-3) 40(9.4,-3) 41(8.6,-3) 42(7.8,-3) 43(7,-3) 44(6.2,-3) 45(5.4,-3) 46(4.6,-3) 47(3.8,-3) 48(3,-3) 49(2.2,-3) 50(1.4,-3) 51(0.6,-3) 52(-0.2,-3) 53(-1,-3) 54(-1.8,-3) 55(-2.6,-3) 56(-3.4,-3) 57(-4.2,-3) 58(-5,-3) 59(-5.8,-3) 60(-6.6,-3) 61(-7.4,-3) 62(-8.2,-3) 63(-9,-3) 64(-9.8,-3) 65(-10.6,-3) 66(-11.4,-3) 67(-12.2,-3) 68(-13,-3)
  round 2.25 hole 1.2: 69(-16.175,0) 70(16.175,0)
  round 3.24 hole 2.45: 71(-19.275,-3.55) 72(-17.485,3.55) 73(19.275,-3.55) 74(17.485,3.55)
  round 1 hole 1.75 unplated mask+0.375: 75(-14.995,-3) 75(14.995,-3)
Top Overlay:
  drawing of 259 lines, arcs and shapes, not listed
  text "68" at -14.4,-5.5 h1.2
  text "1" at 13.8,4.1 h1.2
Mechanical 8:
  drawing of 527 lines, arcs and shapes, not listed
Mechanical 14:
  drawing of 520 lines, arcs and shapes, not listed
  text "68" at -14.4,-5.5 h1.2
  text "1" at 13.8,4.1 h1.2
Mechanical 15:
  lines w0.05: -17.429,-3.25 cw(c-19.275,-3.55) -21.121,-3.25 -21.35,-3.25 -21.35,3.25 -19.331,3.25 cw(c-17.485,3.55) -15.67,4 15.67,4 cw(c17.485,3.55) 19.331,3.25 21.35,3.25 21.35,-3.25 21.121,-3.25 cw(c19.275,-3.55) 17.429,-3.25 16.347,-3.25 cw(c14.995,-3) 14.051,-4 -14.48,-4 cw(c-14.995,-3) -16.092,-3.25 ; -17.429,-3.25 -16.092,-3.25 ; -17.429,-3.25 -16.092,-3.25
3D body "MOLEX_73776-0201.stp": height 10.7, standoff -6.2, extent -21.25,-3.73 21.25,3.73

## MTGP720H320V6P [mm]
pads (1):
  round 7.2 hole 3.25: 1(0,0)
via -2.2,-1.35 diameter 1 hole 0.5
via -2.2,1.375 diameter 1 hole 0.5
via 0,2.525 diameter 1 hole 0.5
via 2.2,1.35 diameter 1 hole 0.5
via 0,-2.625 diameter 1 hole 0.5
via 2.2,-1.35 diameter 1 hole 0.5
Mechanical 8:
  circle w0.1: c0,0 r2.6
  circle w0.1: c0,0 r3.75
  lines w0.1: -2.657,1.625 -2.224,1.375 ; -2.632,-1.6 -2.199,-1.35 ; -2.474,0.942 -2.224,1.375 ; -2.449,-0.917 -2.199,-1.35 ; -1.974,1.808 -2.224,1.375 ; -1.949,-1.783 -2.199,-1.35 ; -1.791,1.125 -2.224,1.375 ; -1.766,-1.1 -2.199,-1.35 ; -0.5,-2.625 0,-2.625 ; -0.5,0 0,0 ; -0.5,2.525 0,2.525 ; 0,-3.125 0,-2.625 ; 0,-2.125 0,-2.625 ; 0,-0.5 0,0 ; 0,0.5 0,0 ; 0,2.025 0,2.525 ; 0,3.025 0,2.525 ; 0.5,-2.625 0,-2.625 ; 0.5,0 0,0 ; 0.5,2.525 0,2.525 ; 1.766,-1.1 2.199,-1.35 ; 1.766,1.1 2.199,1.35 ; 1.949,-1.783 2.199,-1.35 ; 1.949,1.783 2.199,1.35 ; 2.449,-0.917 2.199,-1.35 ; 2.449,0.917 2.199,1.35 ; 2.632,-1.6 2.199,-1.35 ; 2.632,1.6 2.199,1.35
Mechanical 14:
  circle w0.1: c0,0 r3.75
Mechanical 15:
  circle w0.05: c0,0 r3.85
3D body "mtgp720h320v6p.stp": height 0.1, standoff -1.75, extent -3.627,-3.627 3.628,3.628

## PANASONIC_AXK5SA3277YG [mm] "130 Contacts, Narrow-Pitch 0.5mm, Surface Mount, Straight Board Stacking Socket, AXK5S Serie"
height 3.55
pads (132):
  rect 0.5x2 smd: 1(16.125,2.2) 2(16.125,-2.2) 129(-16.125,2.2) 130(-16.125,-2.2)
  rect 0.25x2 smd: 3(15.5,2.2) 4(15.5,-2.2) 5(15,2.2) 6(15,-2.2) 7(14.5,2.2) 8(14.5,-2.2) 9(14,2.2) 10(14,-2.2) 11(13.5,2.2) 12(13.5,-2.2) 13(13,2.2) 14(13,-2.2) 15(12.5,2.2) 16(12.5,-2.2) 17(12,2.2) 18(12,-2.2) 19(11.5,2.2) 20(11.5,-2.2) 21(11,2.2) 22(11,-2.2) 23(10.5,2.2) 24(10.5,-2.2) 25(10,2.2) 26(10,-2.2) 27(9.5,2.2) 28(9.5,-2.2) 29(9,2.2) 30(9,-2.2) 31(8.5,2.2) 32(8.5,-2.2) 33(8,2.2) 34(8,-2.2) 35(7.5,2.2) 36(7.5,-2.2) 37(7,2.2) 38(7,-2.2) 39(6.5,2.2) 40(6.5,-2.2) 41(6,2.2) 42(6,-2.2) 43(5.5,2.2) 44(5.5,-2.2) 45(5,2.2) 46(5,-2.2) 47(4.5,2.2) 48(4.5,-2.2) 49(4,2.2) 50(4,-2.2) 51(3.5,2.2) 52(3.5,-2.2) 53(3,2.2) 54(3,-2.2) 55(2.5,2.2) 56(2.5,-2.2) 57(2,2.2) 58(2,-2.2) 59(1.5,2.2) 60(1.5,-2.2) 61(1,2.2) 62(1,-2.2) 63(0.5,2.2) 64(0.5,-2.2) 65(0,2.2) 66(0,-2.2) 67(-0.5,2.2) 68(-0.5,-2.2) 69(-1,2.2) 70(-1,-2.2) 71(-1.5,2.2) 72(-1.5,-2.2) 73(-2,2.2) 74(-2,-2.2) 75(-2.5,2.2) 76(-2.5,-2.2) 77(-3,2.2) 78(-3,-2.2) 79(-3.5,2.2) 80(-3.5,-2.2) 81(-4,2.2) 82(-4,-2.2) 83(-4.5,2.2) 84(-4.5,-2.2) 85(-5,2.2) 86(-5,-2.2) 87(-5.5,2.2) 88(-5.5,-2.2) 89(-6,2.2) 90(-6,-2.2) 91(-6.5,2.2) 92(-6.5,-2.2) 93(-7,2.2) 94(-7,-2.2) 95(-7.5,2.2) 96(-7.5,-2.2) 97(-8,2.2) 98(-8,-2.2) 99(-8.5,2.2) 100(-8.5,-2.2) 101(-9,2.2) 102(-9,-2.2) 103(-9.5,2.2) 104(-9.5,-2.2) 105(-10,2.2) 106(-10,-2.2) 107(-10.5,2.2) 108(-10.5,-2.2) 109(-11,2.2) 110(-11,-2.2) 111(-11.5,2.2) 112(-11.5,-2.2) 113(-12,2.2) 114(-12,-2.2) 115(-12.5,2.2) 116(-12.5,-2.2) 117(-13,2.2) 118(-13,-2.2) 119(-13.5,2.2) 120(-13.5,-2.2) 121(-14,2.2) 122(-14,-2.2) 123(-14.5,2.2) 124(-14.5,-2.2) 125(-15,2.2) 126(-15,-2.2) 127(-15.5,2.2) 128(-15.5,-2.2)
  round 0.5 hole 0.65 unplated mask+0.075: 131(-17.25,1.5) 132(17.25,-1.5)
Top Overlay:
  circle w0.2: c17.05,2.925 r0.2
  circle w0.25: c17.05,2.925 r0.125
  lines w0.2: -17.5,0.927 -17.5,0.6 -17.4,0.6 -17.4,-0.6 -17.5,-0.6 -17.5,-2.3 -16.675,-2.3 ; -17.5,2.073 -17.5,2.3 -16.675,2.3 ; -17.015,0.921 -17.015,-1.28 ; -16.801,1.066 -16.755,1.02 ; -16.675,-1.28 -17.015,-1.28 ; -16.675,-1.02 -16.755,-1.02 ; -16.675,1.02 -16.755,1.02 ; 16.675,-2.3 17.5,-2.3 17.5,-2.073 ; 16.675,-1.02 16.755,-1.02 ; 16.675,1.02 16.755,1.02 ; 16.675,1.28 17.015,1.28 ; 16.675,2.3 17.5,2.3 17.5,0.6 17.4,0.6 17.4,-0.6 17.5,-0.6 17.5,-0.927 ; 16.801,-1.066 16.755,-1.02 ; 17.015,-0.921 17.015,1.28 ; -17.015,-1.28 -16.755,-1.02 ; -16.755,-1.02 -16.755,1.02 ; 16.755,-1.02 16.755,1.02 ; 16.755,1.02 17.015,1.28
Mechanical 8:
  drawing of 792 lines, arcs and shapes, not listed
Mechanical 14:
  drawing of 428 lines, arcs and shapes, not listed
Mechanical 15:
  lines w0.05: -17.75,-3.45 -17.75,3.45 17.75,3.45 17.75,-3.45 -17.75,-3.45
3D body "PANASONIC_AXK5SA3277YG.stp": height 3.55, standoff -0.45, extent -17.5,-2.7 17.5,2.7

## PANASONIC_AXK6SA3677YG [mm] "130 Contacts, Narrow-Pitch 0.5mm, Surface Mount, Straight Board Stacking Header, AXK6S Serie"
height 5.3
pads (132):
  rect 0.5x2 smd: 1(16.125,-2) 2(16.125,2) 129(-16.125,-2) 130(-16.125,2)
  rect 0.25x2 smd: 3(15.5,-2) 4(15.5,2) 5(15,-2) 6(15,2) 7(14.5,-2) 8(14.5,2) 9(14,-2) 10(14,2) 11(13.5,-2) 12(13.5,2) 13(13,-2) 14(13,2) 15(12.5,-2) 16(12.5,2) 17(12,-2) 18(12,2) 19(11.5,-2) 20(11.5,2) 21(11,-2) 22(11,2) 23(10.5,-2) 24(10.5,2) 25(10,-2) 26(10,2) 27(9.5,-2) 28(9.5,2) 29(9,-2) 30(9,2) 31(8.5,-2) 32(8.5,2) 33(8,-2) 34(8,2) 35(7.5,-2) 36(7.5,2) 37(7,-2) 38(7,2) 39(6.5,-2) 40(6.5,2) 41(6,-2) 42(6,2) 43(5.5,-2) 44(5.5,2) 45(5,-2) 46(5,2) 47(4.5,-2) 48(4.5,2) 49(4,-2) 50(4,2) 51(3.5,-2) 52(3.5,2) 53(3,-2) 54(3,2) 55(2.5,-2) 56(2.5,2) 57(2,-2) 58(2,2) 59(1.5,-2) 60(1.5,2) 61(1,-2) 62(1,2) 63(0.5,-2) 64(0.5,2) 65(0,-2) 66(0,2) 67(-0.5,-2) 68(-0.5,2) 69(-1,-2) 70(-1,2) 71(-1.5,-2) 72(-1.5,2) 73(-2,-2) 74(-2,2) 75(-2.5,-2) 76(-2.5,2) 77(-3,-2) 78(-3,2) 79(-3.5,-2) 80(-3.5,2) 81(-4,-2) 82(-4,2) 83(-4.5,-2) 84(-4.5,2) 85(-5,-2) 86(-5,2) 87(-5.5,-2) 88(-5.5,2) 89(-6,-2) 90(-6,2) 91(-6.5,-2) 92(-6.5,2) 93(-7,-2) 94(-7,2) 95(-7.5,-2) 96(-7.5,2) 97(-8,-2) 98(-8,2) 99(-8.5,-2) 100(-8.5,2) 101(-9,-2) 102(-9,2) 103(-9.5,-2) 104(-9.5,2) 105(-10,-2) 106(-10,2) 107(-10.5,-2) 108(-10.5,2) 109(-11,-2) 110(-11,2) 111(-11.5,-2) 112(-11.5,2) 113(-12,-2) 114(-12,2) 115(-12.5,-2) 116(-12.5,2) 117(-13,-2) 118(-13,2) 119(-13.5,-2) 120(-13.5,2) 121(-14,-2) 122(-14,2) 123(-14.5,-2) 124(-14.5,2) 125(-15,-2) 126(-15,2) 127(-15.5,-2) 128(-15.5,2)
  round 0.5 hole 0.65 unplated mask+0.075: 131(-16.75,-1.05) 132(16.75,1.05)
Top Overlay:
  drawing of 418 lines, arcs and shapes, not listed
Mechanical 8:
  drawing of 794 lines, arcs and shapes, not listed
Mechanical 14:
  drawing of 424 lines, arcs and shapes, not listed
Mechanical 15:
  lines w0.1: -17.75,-2.35 17.75,-2.35 17.75,2.35 -17.75,2.35 -17.75,-2.35
3D body "PANASONIC_AXK6SA3677YG.stp": height 5.3, standoff 0, extent -17.5,-2.5 17.5,2.5

## PB [mm]
Top Overlay:
  circle w0.5: c-0.031,0.013 r2.5
  lines w0.5: -1.737,1.719 1.675,-1.693
  text "Pb" at -1.536,-0.948 h3.05
3D body "pb.stp": height 0.02, standoff 0, extent -2.725,-2.725 2.725,2.725